# Altium footprint library std-th.PcbLib: 245 footprints (part 9 of 16)
Each footprint in its own frame and in the unit in brackets; x right, y up, seen from the top. Pads: shape width x height; smd on the part's side, far side on the other; paste and mask are expansions set on the pad; w line width, h text height; cw(c..) or ccw(c..) is an arc to the next point about the centre after c.
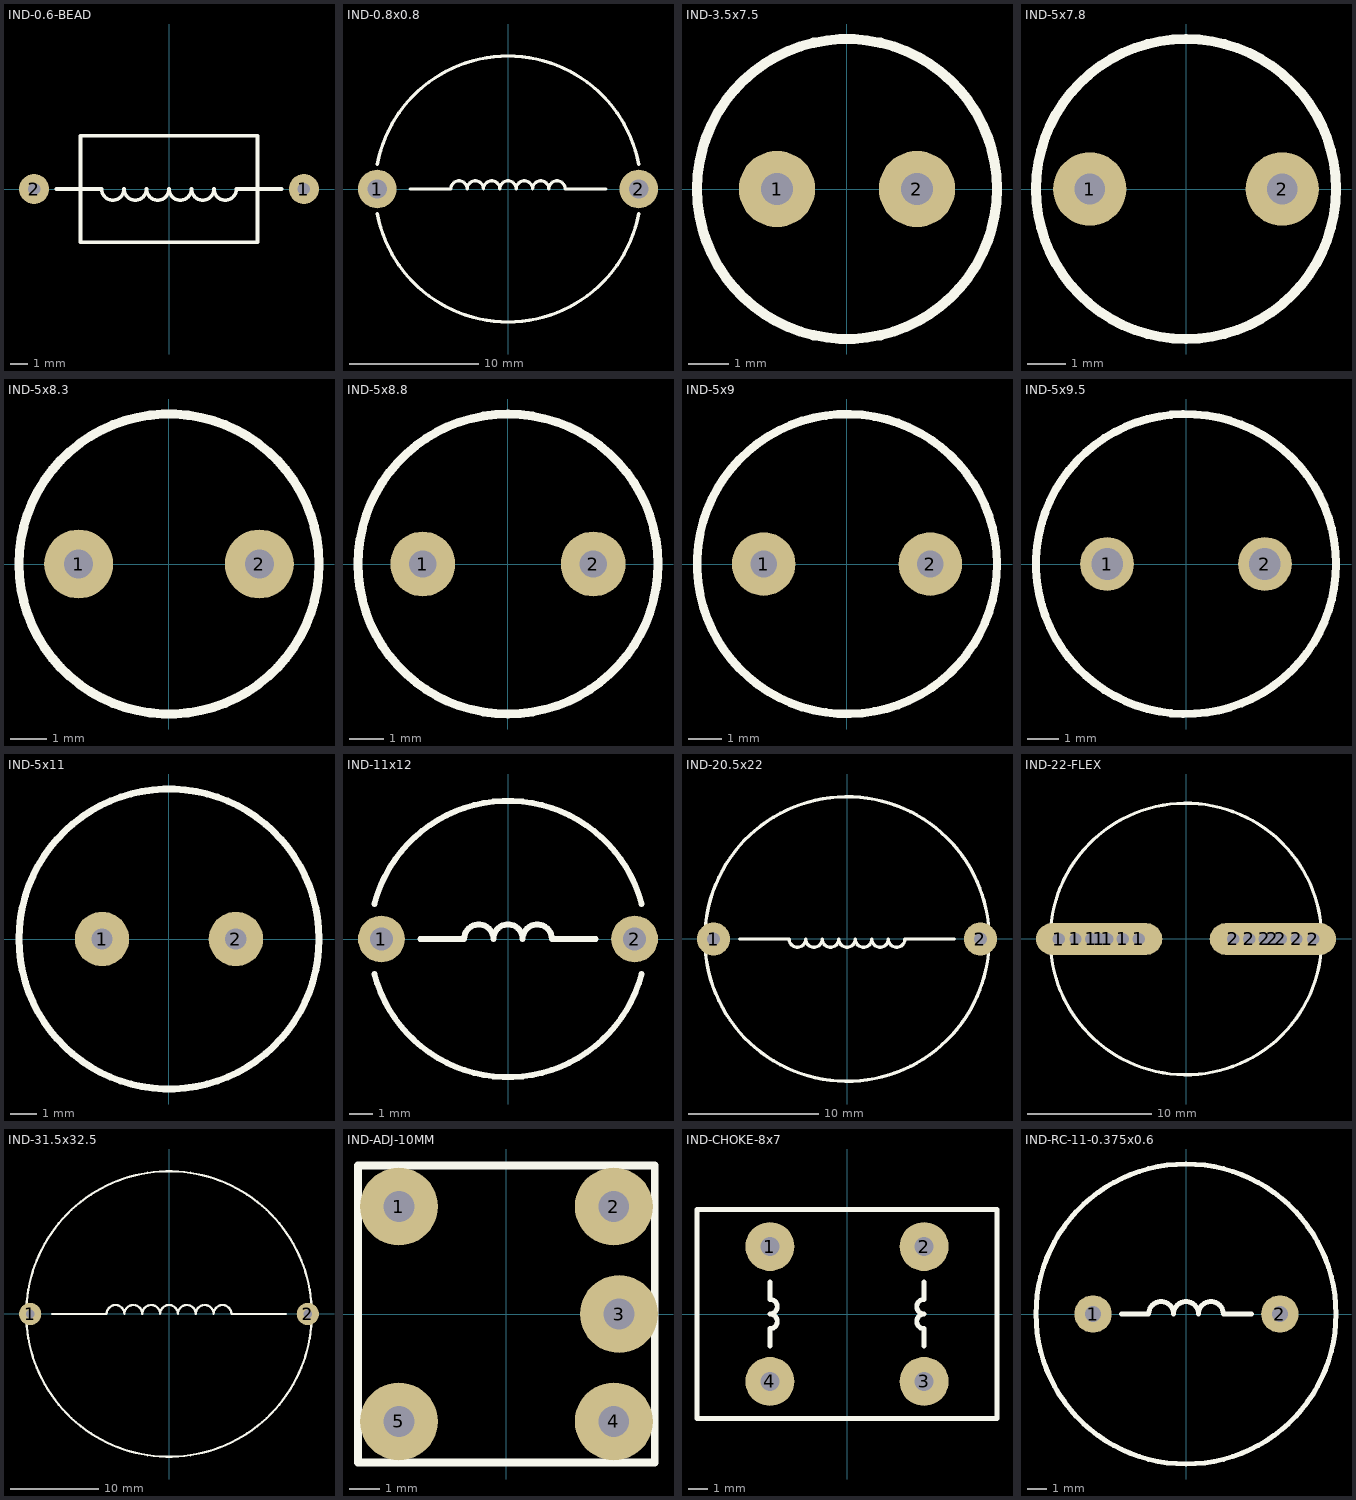
[diagram p8: the footprints below, top view; thin cyan lines are the x and y axes]

## IND-0.6-BEAD [mm] "Ferrite bead, 2 leads, 600 mil spacing, 10 mm length, 6 mm diameter"
height 6
pads (2):
  round 1.7 hole 0.7: 1(7.62,0) 2(-7.62,0)
Top Overlay:
  lines w0.203: -6.35,0 -3.81,0 ccw(c-3.175,0) -2.54,0 ccw(c-1.905,0) -1.27,0 ccw(c-0.635,0) 0,0 ccw(c0.635,0) 1.27,0 ccw(c1.905,0) 2.54,0 ccw(c3.175,0) 3.81,0 6.35,0 ; -5,-3 -5,3 5,3 5,-3 -5,-3
3D body: height 6, standoff -3.05, extent -7.875,-3 7.876,3

## IND-0.8x0.8 [mm] "Inductor, high current, 20 mm pitch"
height 20
pads (2):
  round 3 hole 1.5: 1(-10.16,0) 2(10.16,0)
Top Overlay:
  lines w0.254: -10.16,-1.905 ccw(c0,0) 10.16,-1.905 ; -10.16,1.905 cw(c0,0) 10.16,1.905 ; -7.62,0 -4.445,0 cw(c-3.81,0) -3.175,0 cw(c-2.54,0) -1.905,0 cw(c-1.27,0) -0.635,0 cw(c0,0) 0.635,0 cw(c1.27,0) 1.905,0 cw(c2.54,0) 3.175,0 cw(c3.81,0) 4.445,0 7.62,0
3D body: height 11.43, standoff -12.7, extent -10.922,-10.922 10.922,10.922

## IND-3.5x7.5 [mm] "Inductor, Coilcraft DR0608, 3.5 mm pitch, 7.5 mm dia"
height 10
pads (2):
  round 1.905 hole 0.8: 1(-1.75,0) 2(1.75,0)
Top Overlay:
  circle w0.254: c0,0 r3.75
3D body: height 9.7, standoff -4.8, extent -3.75,-3.75 3.75,3.75

## IND-5x7.8 [mm] "Inductor, 5 mm pitch, 7.8 mm dia"
height 10
pads (2):
  round 1.905 hole 0.8: 1(-2.5,0) 2(2.5,0)
Top Overlay:
  circle w0.254: c0,0 r3.9
3D body: height 9.5, standoff -5, extent -3.9,-3.9 3.9,3.9

## IND-5x8.3 [mm] "Inductor, 5 mm pitch, 8.3 mm dia"
height 10
pads (2):
  round 1.905 hole 0.8: 1(-2.5,0) 2(2.5,0)
Top Overlay:
  circle w0.254: c0,0 r4.15
3D body: height 11.2, standoff -5, extent -4.15,-4.15 4.15,4.15

## IND-5x8.8 [mm] "Inductor, Coilcraft RFB0807, 5 mm pitch, 8.8 mm dia"
height 5
pads (2):
  round 1.905 hole 0.8: 1(-2.5,0) 2(2.5,0)
Top Overlay:
  circle w0.254: c0,0 r4.4
3D body: height 7.5, standoff -3.5, extent -4.4,-4.4 4.4,4.4

## IND-5x9 [mm] "Inductor, 5 mm pitch, 9 mm dia"
height 16
pads (2):
  round 1.905 hole 0.8: 1(-2.5,0) 2(2.5,0)
Top Overlay:
  circle w0.254: c0,0 r4.5
3D body: height 12.98, standoff -4.02, extent -4.5,-4.5 4.5,4.5

## IND-5x9.5 [mm] "Inductor, 2 leads, 5 mm spacing, 9.5 mm diameter"
height 9
pads (2):
  round 1.7 hole 1: 1(-2.5,0) 2(2.5,0)
Top Overlay:
  circle w0.254: c0,0 r4.75
3D body: height 8.93, standoff -3.07, extent -4.75,-4.75 4.75,4.75

## IND-5x11 [mil] "Inductor, TDK TSL1112 Series, 5 mm pitch, 11.2 mm dia"
height 480.31
pads (2):
  round 80 hole 31.5: 1(-98.43,0) 2(98.43,0)
Top Overlay:
  circle w10: c0,0 r220.48
3D body: height 482.28, standoff -196.85, extent -220.46,-220.46 220.48,220.48

## IND-11x12 [mil] "Inductor, SL1215 Series, 11 mm pitch, 12 mm dia"
height 570.87
pads (2):
  round 80 hole 39.37: 1(-216.53,0) 2(216.53,0)
Top Overlay:
  lines w10: -228.57,-59.63 ccw(c0,0) 228.58,-59.63 ; -228.48,59.98 cw(c0,0) 228.49,59.98 ; -150,0 -75,0 cw(c-50,0) -25,0 cw(c0,0) 25,0 cw(c50,0) 75,0 150,0
3D body: height 572.83, standoff -190.34, extent -236.21,-236.21 236.23,236.23

## IND-20.5x22 [mm] "Inductor, 2 leads, 20.5 mm spacing, 22 mm diameter, 2100HT series"
height 10
pads (2):
  round 2.54 hole 1: 1(-10.249,0) 2(10.249,0)
Top Overlay:
  circle w0.254: c0,0 r10.922
  lines w0.254: -8.255,0 -4.445,0 ccw(c-3.81,0) -3.175,0 ccw(c-2.54,0) -1.905,0 ccw(c-1.27,0) -0.635,0 ccw(c0,0) 0.635,0 ccw(c1.27,0) 1.905,0 ccw(c2.54,0) 3.175,0 ccw(c3.81,0) 4.445,0 8.255,0
3D body: height 11.43, standoff -12.7, extent -10.922,-10.922 10.922,10.922

## IND-22-FLEX [mm] "Inductor, 2 leads, 22 mm diameter, flexible pins"
height 10
pads (14):
  round 2.54 hole 1: 1(-10.249,0) 1(-8.89,0) 1(-7.62,0) 1(-6.35,0) 1(-5.08,0) 1(-3.81,0) 2(3.81,0) 2(5.08,0) 2(6.35,0) 2(7.62,0) 2(8.89,0) 2(10.249,0)
  oval 10.16x2.54 hole 1: 1(-6.985,0) 2(6.985,0)
Top Overlay:
  circle w0.254: c0,0 r10.922
  lines w0.254: -8.255,0 -4.445,0 ccw(c-3.81,0) -3.175,0 ; 3.175,0 ccw(c3.81,0) 4.445,0 8.255,0
3D body: height 11.43, standoff -12.7, extent -10.922,-10.922 10.922,10.922

## IND-31.5x32.5 [mm] "Inductor, 2 leads, 31.5 mm spacing, 32.5 mm diameter, 2200LL series"
pads (2):
  round 2.54 hole 1: 1(-15.824,0) 2(15.824,0)
Top Overlay:
  circle w0.254: c0,0 r16.269
  lines w0.254: -13.335,0 -7.112,0 cw(c-6.096,0) -5.08,0 cw(c-4.064,0) -3.048,0 cw(c-2.032,0) -1.016,0 cw(c0,0) 1.016,0 cw(c2.032,0) 3.048,0 cw(c4.064,0) 5.08,0 cw(c6.096,0) 7.112,0 13.335,0
3D body: height 15.66, standoff -12.7, extent -16.269,-16.214 16.269,16.215

## IND-ADJ-10MM [mm]
pads (5):
  round 2.54 hole 1: 1(-3.505,3.505) 2(3.505,3.505) 3(3.675,0) 4(3.505,-3.505) 5(-3.505,-3.505)
Top Overlay:
  lines w0.254: -4.84,-4.84 -4.84,4.84 4.84,4.84 4.84,-4.84 -4.84,-4.84
3D body: height 12.9, standoff -3.35, extent -4.84,-4.84 4.84,4.84

## IND-CHOKE-8x7 [mm]
pads (4):
  round 2.54 hole 1: 1(-4,3.5) 2(4,3.5) 3(4,-3.5) 4(-4,-3.5)
Top Overlay:
  lines w0.254: -4,-1.651 -4,-0.762 ccw(c-4,-0.381) -4,0 ccw(c-4,0.381) -4,0.762 -4,1.651 ; 4,-1.651 4,-0.762 cw(c4,-0.381) 4,0 cw(c4,0.381) 4,0.762 4,1.651 ; -7.782,-5.425 -7.782,5.425 7.781,5.425 7.781,-5.425 -7.782,-5.425
3D body: height 15.45, standoff -3, extent -7.782,-5.425 7.781,5.425

## IND-RC-11-0.375x0.6 [mil] "Inductor, Triad Magnetics, RC-11, 375 mil pitch, 600 mil diameter"
height 1181.1
pads (2):
  round 75 hole 31.5: 1(-187.5,0) 2(187.5,0)
Top Overlay:
  circle w10: c-0.96,0 r300.96
  lines w10: -130,0 -75.96,0 cw(c-50.96,0) -25.96,0 cw(c-0.96,0) 24.04,0 cw(c49.04,0) 74.04,0 130,0
3D body: height 930, standoff -150, extent -300,-300 300,300